# Altium footprint library 3D_MIG_Controller.PCBLIB: 560 footprints (part 12 of 35)
Each footprint in its own frame and in the unit in brackets; x right, y up, seen from the top. Pads: shape width x height; smd on the part's side, far side on the other; paste and mask are expansions set on the pad; w line width, h text height; cw(c..) or ccw(c..) is an arc to the next point about the centre after c.
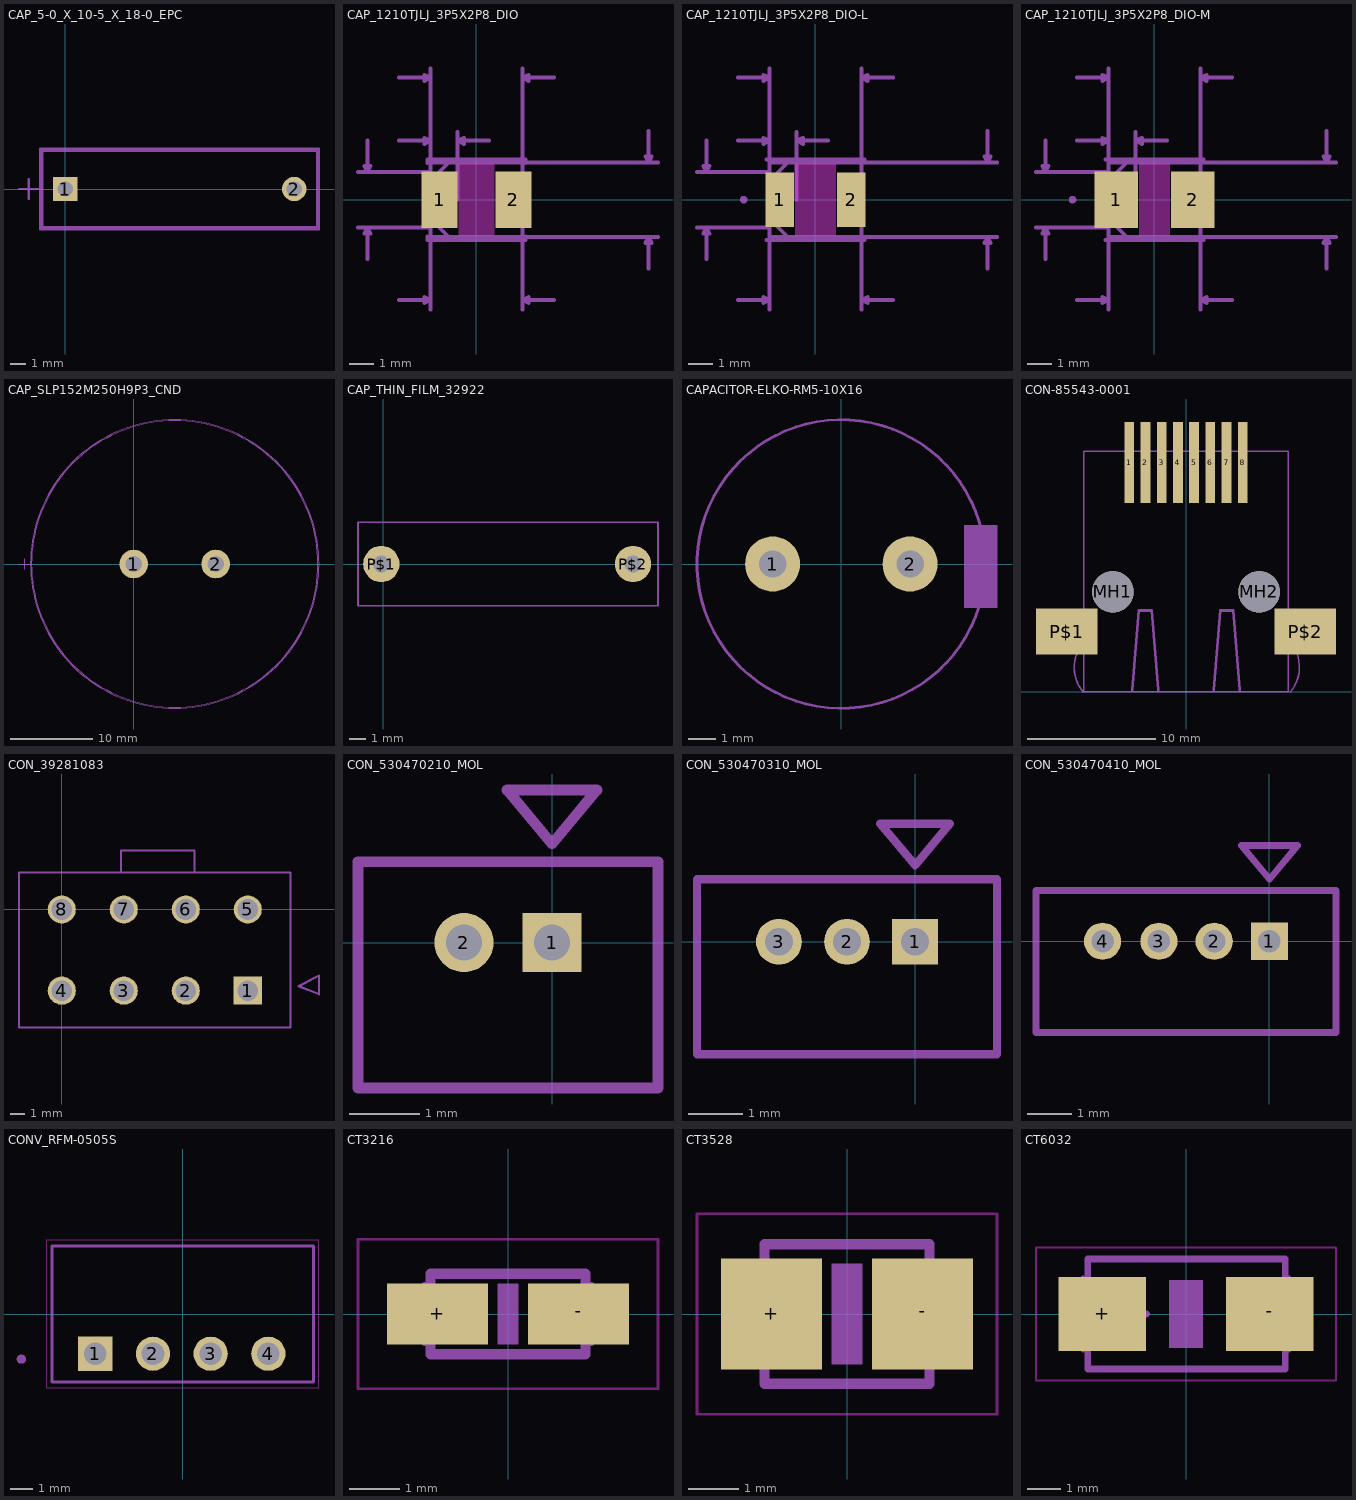
[diagram p11: the footprints below, top view; thin cyan lines are the x and y axes]

## CAP_5-0_X_10-5_X_18-0_EPC [mm]
pads (2):
  rect 1.6x1.6 / inner round 1.478 / far side rect 1.6x1.6 hole 1: 1(0,0)
  round 1.6 hole 1: 2(14.986,0)
tDocu:
  lines w0.152: -3.023,0 -1.753,0 ; -2.388,-0.635 -2.388,0.635 ; -1.499,-2.489 16.485,-2.489 16.485,2.489 -1.499,2.489 -1.499,-2.489
tPlace:
  lines w0.152: -3.023,0 -1.753,0 ; -2.388,-0.635 -2.388,0.635 ; -1.626,-2.642 16.612,-2.642 16.612,2.642 -1.626,2.642 -1.626,-2.642

## CAP_1210TJLJ_3P5X2P8_DIO [mil]
pads (2):
  rect 57x89 smd: 1(-58.5,0) 2(58.5,0)
Top keep-out:
  region: -28,57 28,57 28,-57 -28,-57
  region: -28,57 28,57 28,-57 -28,-57
tDocu:
  lines w6: -73,-44 -73,-30 ; -73,44 -73,30 ; -44,-59 -73,-30 ; -44,59 -73,30 ; 73,-43 73,44 ; -73,-30 -73,30 ; -73,-59 73,-59 73,59 -73,59 -73,-59
tPlace:
  lines w6: -78,-58 -78,-64 78,-64 78,-58 ; -78,58 -78,64 78,64 78,58
Measures:
  lines w6: -188,-44 -173,-44 ; -188,44 -173,44 ; -173,-94 -173,-44 ; -173,94 -173,44 ; -123,-159 -73,-159 ; -123,94 -73,94 ; -123,194 -73,194 ; -73,-174 -73,-159 ; -73,-44 -173,-44 ; -73,208 -73,194 ; -30,0 -30,94 ; -30,108 -30,94 ; 0,-59 273,-59 ; 0,59 273,59 ; 20,94 -30,94 ; 73,-174 73,-159 ; 73,208 73,194 ; 123,-159 73,-159 ; 123,194 73,194 ; 273,-109 273,-59 ; 273,109 273,59 ; 288,-59 273,-59 ; 288,59 273,59 ; -173,-44 -178,-54 -168,-54 -173,-44 ; -173,44 -73,44 ; -173,44 -178,54 -168,54 -173,44 ; -73,-159 -73,44 ; -73,-159 -83,-154 -83,-164 -73,-159 ; -73,44 -73,94 ; -73,94 -73,194 ; -73,94 -83,98 -83,88 -73,94 ; -73,194 -83,198 -83,188 -73,194 ; -30,94 -20,98 -20,88 -30,94 ; 73,-159 73,194 ; 73,-159 83,-154 83,-164 73,-159 ; 73,194 83,198 83,188 73,194 ; 273,-59 268,-69 278,-69 273,-59 ; 273,59 268,69 278,69 273,59
  text "Default Padstyle: RX57Y89D0T" at -599,-364 h77.5
  text "Alt 1 Padstyle: OX60Y90D30P" at -583,-440 h77.5
  text "Alt 2 Padstyle: OX90Y60D30P" at -583,-514 h77.5
  text "0.146in/3.708mm" at -159,214 h38.75
  text "0.043in/1.092mm" at -211,114 h38.75
  text "0.087in/2.21mm" at -489,-12 h38.75
  text "0.118in/2.997mm" at 293,-12 h38.75
  text "0.146in/3.708mm" at -159,-204 h38.75

## CAP_1210TJLJ_3P5X2P8_DIO-L [mil]
pads (2):
  rect 45x87 smd: 1(-56.5,0) 2(56.5,0)
Top keep-out:
  region: -32,57 32,57 32,-57 -32,-57
  region: -32,57 32,57 32,-57 -32,-57
tDocu:
  lines w0: -60,0 ccw(c-57,0) -54,0 ccw(c-57,0) -60,0
  lines w6: -73,-44 -73,-30 ; -73,44 -73,30 ; -44,-59 -73,-30 ; -44,59 -73,30 ; 73,-43 73,44 ; -73,-30 -73,30 ; -73,-59 73,-59 73,59 -73,59 -73,-59
tPlace:
  lines w6: -78,-64 78,-64 ; -78,64 78,64 ; -117,0 ccw(c-114,0) -111,0 ccw(c-114,0) -117,0
Measures:
  lines w6: -188,-44 -173,-44 ; -188,44 -173,44 ; -173,-94 -173,-44 ; -173,94 -173,44 ; -123,-159 -73,-159 ; -123,94 -73,94 ; -123,194 -73,194 ; -73,-174 -73,-159 ; -73,-44 -173,-44 ; -73,208 -73,194 ; -30,0 -30,94 ; -30,108 -30,94 ; 0,-59 273,-59 ; 0,59 273,59 ; 20,94 -30,94 ; 73,-174 73,-159 ; 73,208 73,194 ; 123,-159 73,-159 ; 123,194 73,194 ; 273,-109 273,-59 ; 273,109 273,59 ; 288,-59 273,-59 ; 288,59 273,59 ; -173,-44 -178,-54 -168,-54 -173,-44 ; -173,44 -73,44 ; -173,44 -178,54 -168,54 -173,44 ; -73,-159 -73,44 ; -73,-159 -83,-154 -83,-164 -73,-159 ; -73,44 -73,94 ; -73,94 -73,194 ; -73,94 -83,98 -83,88 -73,94 ; -73,194 -83,198 -83,188 -73,194 ; -30,94 -20,98 -20,88 -30,94 ; 73,-159 73,194 ; 73,-159 83,-154 83,-164 73,-159 ; 73,194 83,198 83,188 73,194 ; 273,-59 268,-69 278,-69 273,-59 ; 273,59 268,69 278,69 273,59
  text "Default Padstyle: RX45Y87D0T" at -599,-364 h77.5
  text "Alt 1 Padstyle: OX60Y90D30P" at -583,-438 h77.5
  text "Alt 2 Padstyle: OX90Y60D30P" at -583,-514 h77.5
  text "0.146in/3.708mm" at -159,214 h38.75
  text "0.043in/1.092mm" at -211,114 h38.75
  text "0.087in/2.21mm" at -489,-12 h38.75
  text "0.118in/2.997mm" at 293,-12 h38.75
  text "0.146in/3.708mm" at -159,-204 h38.75

## CAP_1210TJLJ_3P5X2P8_DIO-M [mil]
pads (2):
  rect 69x89 smd: 1(-60.5,0) 2(60.5,0)
Top keep-out:
  region: -24,57 24,57 24,-57 -24,-57
  region: -24,57 24,57 24,-57 -24,-57
tDocu:
  lines w0: -64,0 ccw(c-61,0) -58,0 ccw(c-61,0) -64,0
  lines w6: -73,-44 -73,-30 ; -73,44 -73,30 ; -44,-59 -73,-30 ; -44,59 -73,30 ; 73,-43 73,44 ; -73,-30 -73,30 ; -73,-59 73,-59 73,59 -73,59 -73,-59
tPlace:
  lines w6: -78,-64 78,-64 ; -78,64 78,64 ; -133,0 ccw(c-130,0) -127,0 ccw(c-130,0) -133,0
Measures:
  lines w6: -188,-44 -173,-44 ; -188,44 -173,44 ; -173,-94 -173,-44 ; -173,94 -173,44 ; -123,-159 -73,-159 ; -123,94 -73,94 ; -123,194 -73,194 ; -73,-174 -73,-159 ; -73,-44 -173,-44 ; -73,208 -73,194 ; -30,0 -30,94 ; -30,108 -30,94 ; 0,-59 273,-59 ; 0,59 273,59 ; 20,94 -30,94 ; 73,-174 73,-159 ; 73,208 73,194 ; 123,-159 73,-159 ; 123,194 73,194 ; 273,-109 273,-59 ; 273,109 273,59 ; 288,-59 273,-59 ; 288,59 273,59 ; -173,-44 -178,-54 -168,-54 -173,-44 ; -173,44 -73,44 ; -173,44 -178,54 -168,54 -173,44 ; -73,-159 -73,44 ; -73,-159 -83,-154 -83,-164 -73,-159 ; -73,44 -73,94 ; -73,94 -73,194 ; -73,94 -83,98 -83,88 -73,94 ; -73,194 -83,198 -83,188 -73,194 ; -30,94 -20,98 -20,88 -30,94 ; 73,-159 73,194 ; 73,-159 83,-154 83,-164 73,-159 ; 73,194 83,198 83,188 73,194 ; 273,-59 268,-69 278,-69 273,-59 ; 273,59 268,69 278,69 273,59
  text "Default Padstyle: RX69Y89D0T" at -599,-364 h77.5
  text "Alt 1 Padstyle: OX60Y90D30P" at -583,-440 h77.5
  text "Alt 2 Padstyle: OX90Y60D30P" at -583,-514 h77.5
  text "0.146in/3.708mm" at -159,214 h38.75
  text "0.043in/1.092mm" at -211,114 h38.75
  text "0.087in/2.21mm" at -489,-12 h38.75
  text "0.118in/2.997mm" at 293,-12 h38.75
  text "0.146in/3.708mm" at -159,-204 h38.75

## CAP_SLP152M250H9P3_CND [mil]
pads (2):
  round 137.8 hole 78.7: 1(0,0) 2(394,0)
tDocu:
  lines w0: -492,0 ccw(c197,0) 886,0 ; -492,0 cw(c197,0) 886,0 ; -492,0 ccw(c197,0) 886,0 ; -492,0 cw(c197,0) 886,0
  lines w6: -552,0 -502,0 ; -527,-25 -527,25
tPlace:
  lines w6: -552,0 -502,0 ; -527,-25 -527,25 ; -497,0 ccw(c197,0) 891,0 ; -497,0 cw(c197,0) 891,0 ; -497,0 ccw(c197,0) 891,0 ; -497,0 cw(c197,0) 891,0

## CAP_THIN_FILM_32922 [mil]
pads (2):
  round 86 hole 39.37: P$1(-3.94,0) P$2(590.55,0)
tPlace:
  lines w3.94: -59.06,-98.43 649.61,-98.43 649.61,98.43 -59.06,98.43 -59.06,-98.43

## CAPACITOR-ELKO-RM5-10X16 [mm]
pads (2):
  round 2 hole 1: 1(-2.5,0) 2(2.5,0)
tPlace:
  circle w0.1: c0,0 r5.25
  region: 4.474,-1.598 4.474,1.402 5.664,1.402 5.664,-1.598
  text "+" at -5.175,-1 h1.7

## CON-85543-0001 [mil]
pads (12):
  rect 30x250 smd: 1(-175,705) 2(-125,705) 3(-75,705) 4(-25,705) 5(25,705) 6(75,705) 7(125,705) 8(175,705)
  round 128 hole 128 unplated: MH1(-225,307) MH2(225,307)
  rect 188.98x141.73 smd: P$1(-367.2,185.04) P$2(367.2,185.04)
tDocu:
  region: -445,135 -445,230 -315,230 -315,135
  region: 315,135 315,230 445,230 445,135
  lines w5: -327,158 -325,151 cw(c-343.22,145.8) -327,136 ccw(c-225.44,74.66) -316,-2 ; 321,-1 ccw(c230.44,75.66) 332,137 cw(c348.22,146.8) 330,152 332,159 ; -315,0 315,0 315,740 -315,740 -315,0
  lines w8: -165,5 -145,250 -105,250 -85,5 ; 85,5 105,250 145,250 165,5

## CON_39281083 [mil]
pads (8):
  rect 75x75 / inner round 69.29 / far side rect 75x75 hole 55: 1(496.06,-216.54)
  round 75 hole 55: 2(330.71,-216.54) 3(165.35,-216.54) 4(0,-216.54) 5(496.06,0) 6(330.71,0) 7(165.35,0) 8(0,0)
tDocu:
  lines w6: 631.78,-204.72 685.95,-175.79 685.95,-225.79 631.78,-204.72
tPlace:
  lines w5: 157.48,98.43 157.48,157.48 354.33,157.48 354.33,98.43
  lines w6: -114.17,-314.96 -114.17,98.43 157.48,98.43 354.33,98.43 610.24,98.43 610.24,-314.96 -114.17,-314.96 ; 631.78,-204.72 685.95,-175.79 685.95,-225.79 631.78,-204.72

## CON_530470210_MOL [mil]
pads (2):
  rect 33x33 / inner round 30.49 / far side rect 33x33 hole 20: 1(0,0)
  round 33 hole 20: 2(-49,0)
tDocu:
  lines w6: -108,-81 59,-81 59,45 -108,45 -108,-81 ; -25,85 25,85 0,55 -25,85
tPlace:
  lines w6: -108,-81 -108,45 59,45 59,-81 -108,-81 ; -25,85 25,85 0,55 -25,85

## CON_530470310_MOL [mil]
pads (3):
  rect 33x33 / inner round 30.49 / far side rect 33x33 hole 20: 1(0,0)
  round 33 hole 20: 2(-49,0) 3(-98,0)
tDocu:
  lines w6: -157,-81 59,-81 59,45 -157,45 -157,-81 ; -25,85 25,85 0,55 -25,85
tPlace:
  lines w6: -157,-81 -157,45 59,45 59,-81 -157,-81 ; -25,85 25,85 0,55 -25,85

## CON_530470410_MOL [mil]
pads (4):
  rect 33x33 / inner round 30.49 / far side rect 33x33 hole 20: 1(0,0)
  round 33 hole 20: 2(-49,0) 3(-98,0) 4(-148,0)
tDocu:
  lines w6: -207,-81 59,-81 59,45 -207,45 -207,-81 ; -25,85 25,85 0,55 -25,85
tPlace:
  lines w6: -207,-81 -207,45 59,45 59,-81 -207,-81 ; -25,85 25,85 0,55 -25,85

## CONV_RFM-0505S [mm]
pads (4):
  rect 1.508x1.508 / inner round 1.393 / far side rect 1.508x1.508 hole 1: 1(-3.85,-1.75)
  round 1.508 hole 1: 2(-1.31,-1.75) 3(1.23,-1.75) 4(3.77,-1.75)
Top keep-out:
  lines w0.05: -6,-3.25 -6,3.25 6,3.25 6,-3.25 -6,-3.25
tDocu:
  circle w0.2: c-7.1,-1.99 r0.1
  lines w0.127: -5.75,-3 -5.75,3 5.75,3 5.75,-3 -5.75,-3
tPlace:
  circle w0.2: c-7.11,-1.99 r0.1
  lines w0.127: -5.75,-3 -5.75,3 5.75,3 5.75,-3 -5.75,-3

## CT3216 [mm]
pads (2):
  rect 2x1.2 smd: +(-1.4,0) -(1.4,0)
Top keep-out:
  lines w0.051: -2.973,-1.483 2.973,-1.483 2.973,1.483 -2.973,1.483 -2.973,-1.483
tDocu:
  lines w0.152: -1.651,-0.559 -1.651,0.559 ; 1.651,-0.559 1.651,0.559
  lines w0.203: -1.26,0 -0.7,0 ; -0.97,-0.3 -0.97,0.26 ; -1.535,-0.798 -1.535,0.798 1.535,0.798 1.535,-0.798 -1.535,-0.798
tGlue:
  region: -0.2,-0.6 -0.2,0.6 0.2,0.6 0.2,-0.6

## CT3528 [mm]
pads (2):
  rect 2x2.2 smd: +(-1.5,0) -(1.5,0)
Top keep-out:
  lines w0.051: -2.973,-1.983 2.973,-1.983 2.973,1.983 -2.973,1.983 -2.973,-1.983
tDocu:
  lines w0.152: -1.778,-1.016 -1.778,1.016 ; 1.778,-1.016 1.778,1.016
  lines w0.203: -1.31,0 -0.68,0 ; -1,-0.33 -1,0.3 ; -1.637,-1.383 -1.637,1.383 1.637,1.383 1.637,-1.383 -1.637,-1.383
tGlue:
  region: -0.3,-1 -0.3,1 0.3,1 0.3,-1

## CT6032 [mil]
pads (2):
  rect 102.36x86.61 smd: +(-98.43,0) -(98.43,0)
Top keep-out:
  lines w2: -176.1,-78.07 176.1,-78.07 176.1,78.07 -176.1,78.07 -176.1,-78.07
tDocu:
  lines w6: -120.98,-42.01 -120.98,42.01 ; 120.98,-42.01 120.98,42.01
  lines w8: -96.46,0 -46.46,0 ; -70.87,-25.2 -70.87,24.8 ; -115.43,-64.45 -115.43,64.45 116.42,64.45 116.42,-64.45 -115.43,-64.45
tGlue:
  region: -19.69,-39.37 -19.69,39.37 19.69,39.37 19.69,-39.37